# Altium footprint library PCBLIB.PcbLib: 775 footprints (part 34 of 49)
Each footprint in its own frame and in the unit in brackets; x right, y up, seen from the top. Pads: shape width x height; smd on the part's side, far side on the other; paste and mask are expansions set on the pad; w line width, h text height; cw(c..) or ccw(c..) is an arc to the next point about the centre after c.
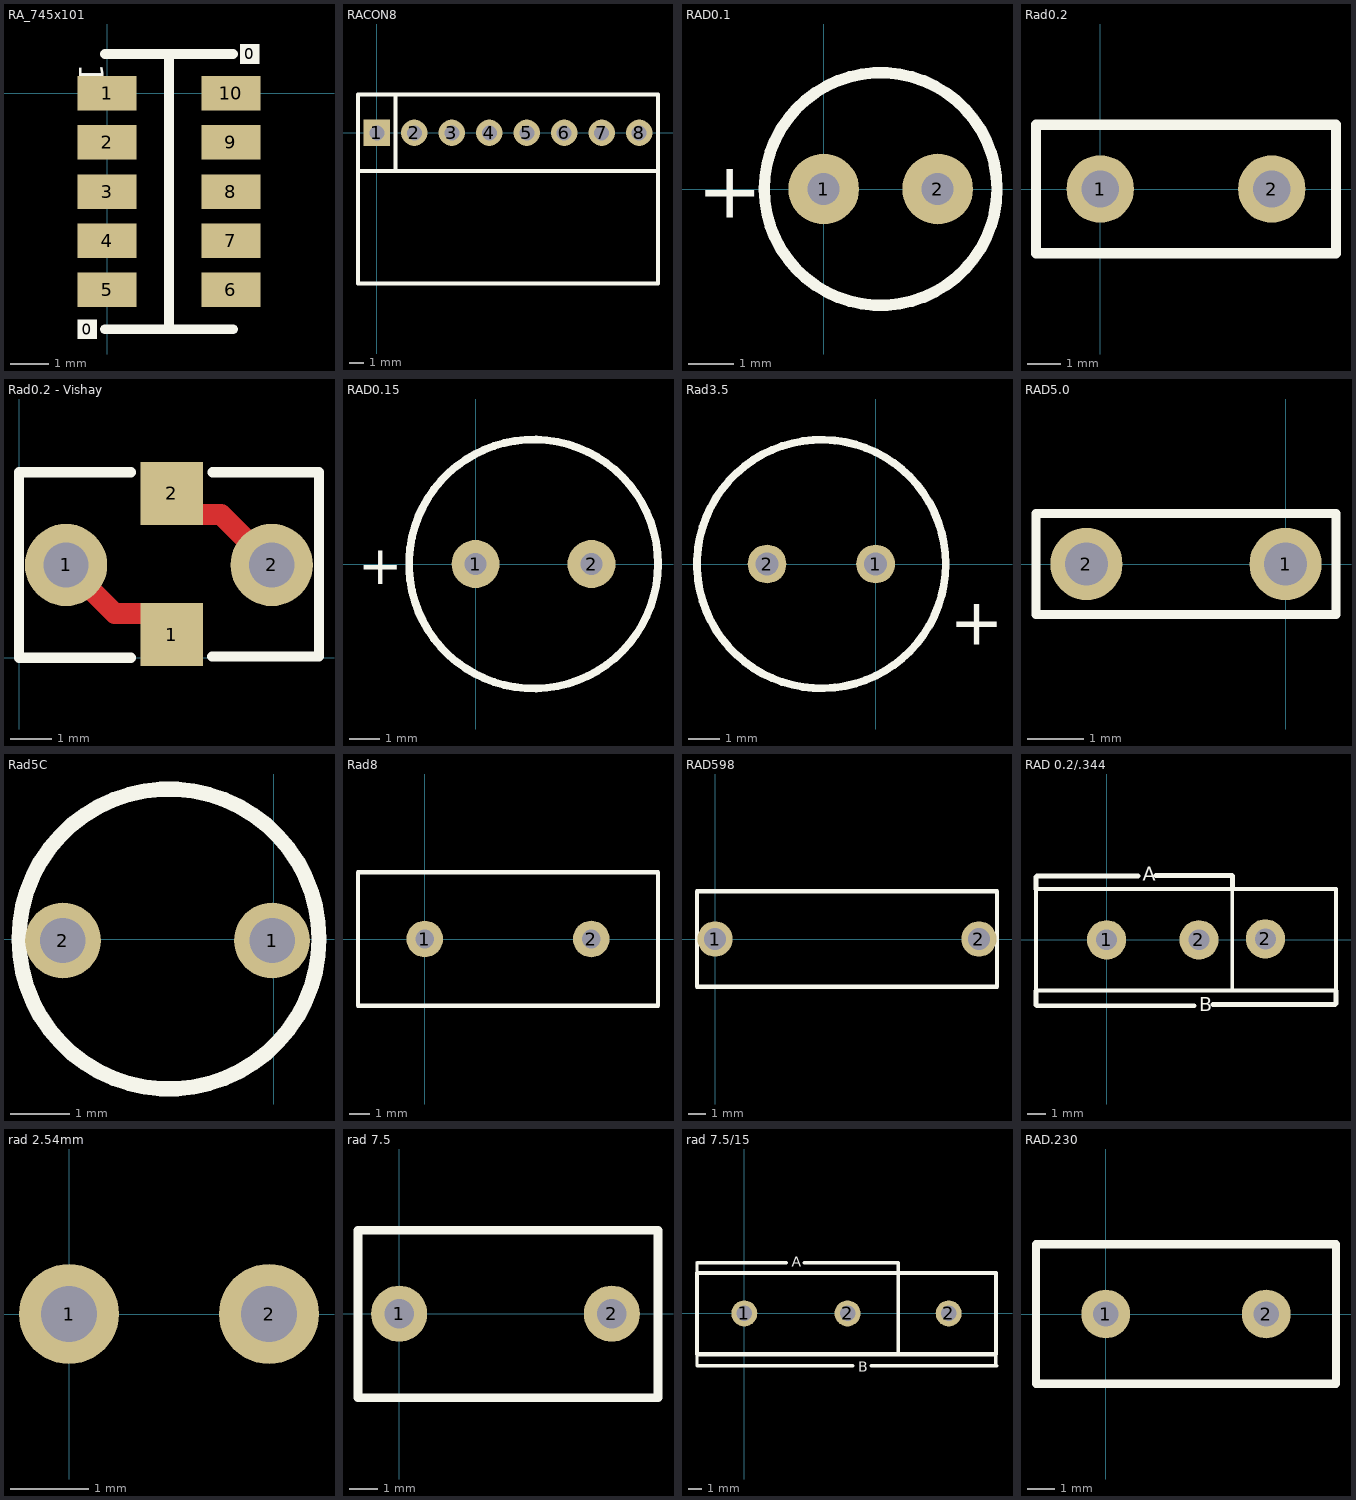
[diagram p33: the footprints below, top view; thin cyan lines are the x and y axes]

## RA_745x101 [mil]
height 5
pads (12):
  rect 20x20 on Top Overlay: 0(-20,-240) 0(145,40)
  rect 60x35 smd: 1(0,0) 2(0,-50) 3(0,-100) 4(0,-150) 5(0,-200) 6(126,-200) 7(126,-150) 8(126,-100) 9(126,-50) 10(126,0)
TopOverlay:
  lines w10: -2,-240 128,-240 ; -2,40 128,40 ; 63,-240 63,40
  text "1" at -28.26,30.21 h25

## RACON8 [mil]
pads (8):
  rect 70x70 hole 40: 1(0,0)
  round 70 hole 40: 2(100,0) 3(200,0) 4(300,0) 5(400,0) 6(500,0) 7(600,0) 8(700,0)
TopOverlay:
  lines w10: 50,-102 50,102 ; -50,-102 750,-102 ; -50,-102 -50,102 750,102 750,-102 ; -50,-102 -50,-402 750,-402 750,-102
Mechanical4:
  text ".400" at 0,0 h1

## RAD0.1 [mil]
pads (2):
  round 62 hole 28: 1(0,0) 2(100,0)
TopOverlay:
  circle w10: c50,0 r102
  text "+" at -111,-25 h50
Mechanical4:
  text ".325" at 0,0 h1

## Rad0.2 [mm]
pads (2):
  round 2 hole 1.1: 1(0,0) 2(5.08,0)
TopOverlay:
  lines w0.305: -1.905,-1.905 6.985,-1.905 6.985,1.905 -1.905,1.905 -1.905,-1.905
Mechanical4:
  text ".325" at 0,0 h0.03

## Rad0.2 - Vishay [mil]
pads (4):
  round 78.74 hole 43.31: 1(45,88.58) 2(241.73,88.58)
  rect 60x60 smd: 1(146,22) 2(146,157)
TopLayer:
  lines w20: 45,88.58 91.58,42 125,42 ; 161,137 193.31,137 241.73,88.58
TopOverlay:
  lines w10: 107,0 0,0 0,177.17 107.17,177.17 ; 185,1 287,1 287,177.17 185.17,177.17
Mechanical4:
  text ".325" at 75,74 h1

## RAD0.15 [mil]
pads (2):
  round 62 hole 28: 1(0,0) 2(150,0)
TopOverlay:
  circle w10: c75,0 r161
  text "+" at -152,-26 h50
Mechanical4:
  text ".325" at 0,0 h1

## Rad3.5 [mm]
pads (2):
  round 1.25 hole 0.75: 1(0,0) 2(-3.505,0)
TopOverlay:
  circle w0.25: c-1.753,0 r4.013
  text "+" at 2.395,-2.6 h1.52
Mechanical4:
  text ".325" at 0,0 h0.03

## RAD5.0 [mil]
pads (2):
  round 50 hole 30: 1(0,0) 2(-138,0)
TopOverlay:
  lines w6: -173,-35 -173,35 35,35 35,-35 -173,-35
Mechanical4:
  text ".250" at 0,0 h1

## Rad5C [mil]
pads (2):
  round 50 hole 30: 1(-1,-1) 2(-139,-1)
TopOverlay:
  circle w10: c-69,0 r99
Mechanical4:
  text ".250" at -1,-1 h1

## Rad8 [mil]
pads (2):
  round 70 hole 36: 1(0,0) 2(318.9,0)
TopOverlay:
  lines w7.87: -127.95,-127.95 0,-127.95 318.9,-127.95 446.85,-127.95 446.85,127.95 318.9,127.95 0,127.95 -127.95,127.95 -127.95,-127.95
Mechanical4:
  text ".325" at 0,0 h1

## RAD598 [mil]
pads (2):
  round 80 hole 50: 1(0,0) 2(598,0)
TopOverlay:
  lines w10: -41,-108 -41,108 639,108 639,-108 -41,-108

## RAD 0.2/.344 [mil]
pads (3):
  round 85 hole 45: 1(0,0) 2(200,0) 2(344,2)
TopOverlay:
  lines w8: 272,-109.45 272,110 ; -153,-110 497,-110 497,2 497,110 -153,110 -153,-110
  lines w10: -153,-110 -153,-141.48 -151.6,-142.88 189.93,-142.88 ; -153,110 -153,136.24 -151.05,138.18 68.46,138.18 ; 106.59,139.27 271.64,139.27 272.73,138.18 272.73,110 ; 230.24,-140.16 495.51,-140.16 497,-138.67 497,-110
  text "B" at 200.28,-154.87 h30
  text "A" at 78.27,128.38 h30

## rad 2.54mm [mil]
pads (2):
  round 50 hole 28: 1(0,0) 2(100,0)
Mechanical4:
  text ".005" at 0,0 h1

## rad 7.5 [mm]
pads (2):
  round 2 hole 1.05: 1(0,0) 2(7.58,0)
TopOverlay:
  lines w0.305: -1.468,-2.997 9.226,-2.997 9.226,2.972 -1.468,2.972 -1.468,-2.997
Mechanical4:
  text ".325" at 1.25,0 h0.03

## rad 7.5/15 [mil] "7.5mm Radial"
pads (3):
  round 75 hole 45: 1(0,0) 2(298.43,0) 2(590.56,0.02)
TopOverlay:
  lines w10: -136.53,-118 -136.53,-150.06 -135.9,-150.69 312.99,-150.69 ; -136.53,117 -136.53,145.76 -135.9,146.39 121.69,146.39 ; 173.87,146.39 444.5,146.03 444.5,117 ; 366.6,-151.05 729.99,-150.74 ; 444.96,-117.28 444.96,117 ; 726.77,-150.74 726.77,-118
  lines w12: -136.53,-118 -136.53,117 726.77,117 726.77,-118 -136.53,-118
  text "B" at 329.65,-168.08 h30
  text "A" at 136.91,134.8 h30
Mechanical4:
  text ".325" at 49.21,0 h1

## RAD.230 [mil]
pads (2):
  round 70 hole 36: 1(0,0) 2(230,0)
TopOverlay:
  lines w12: -100,-100 -100,100 330,100 330,-100 -100,-100
Mechanical4:
  text ".325" at 0,0 h1